# Altium footprint library Metric_Thru_Hole.PcbLib: 91 footprints (part 6 of 6)
Each footprint in its own frame and in the unit in brackets; x right, y up, seen from the top. Pads: shape width x height; smd on the part's side, far side on the other; paste and mask are expansions set on the pad; w line width, h text height; cw(c..) or ccw(c..) is an arc to the next point about the centre after c.
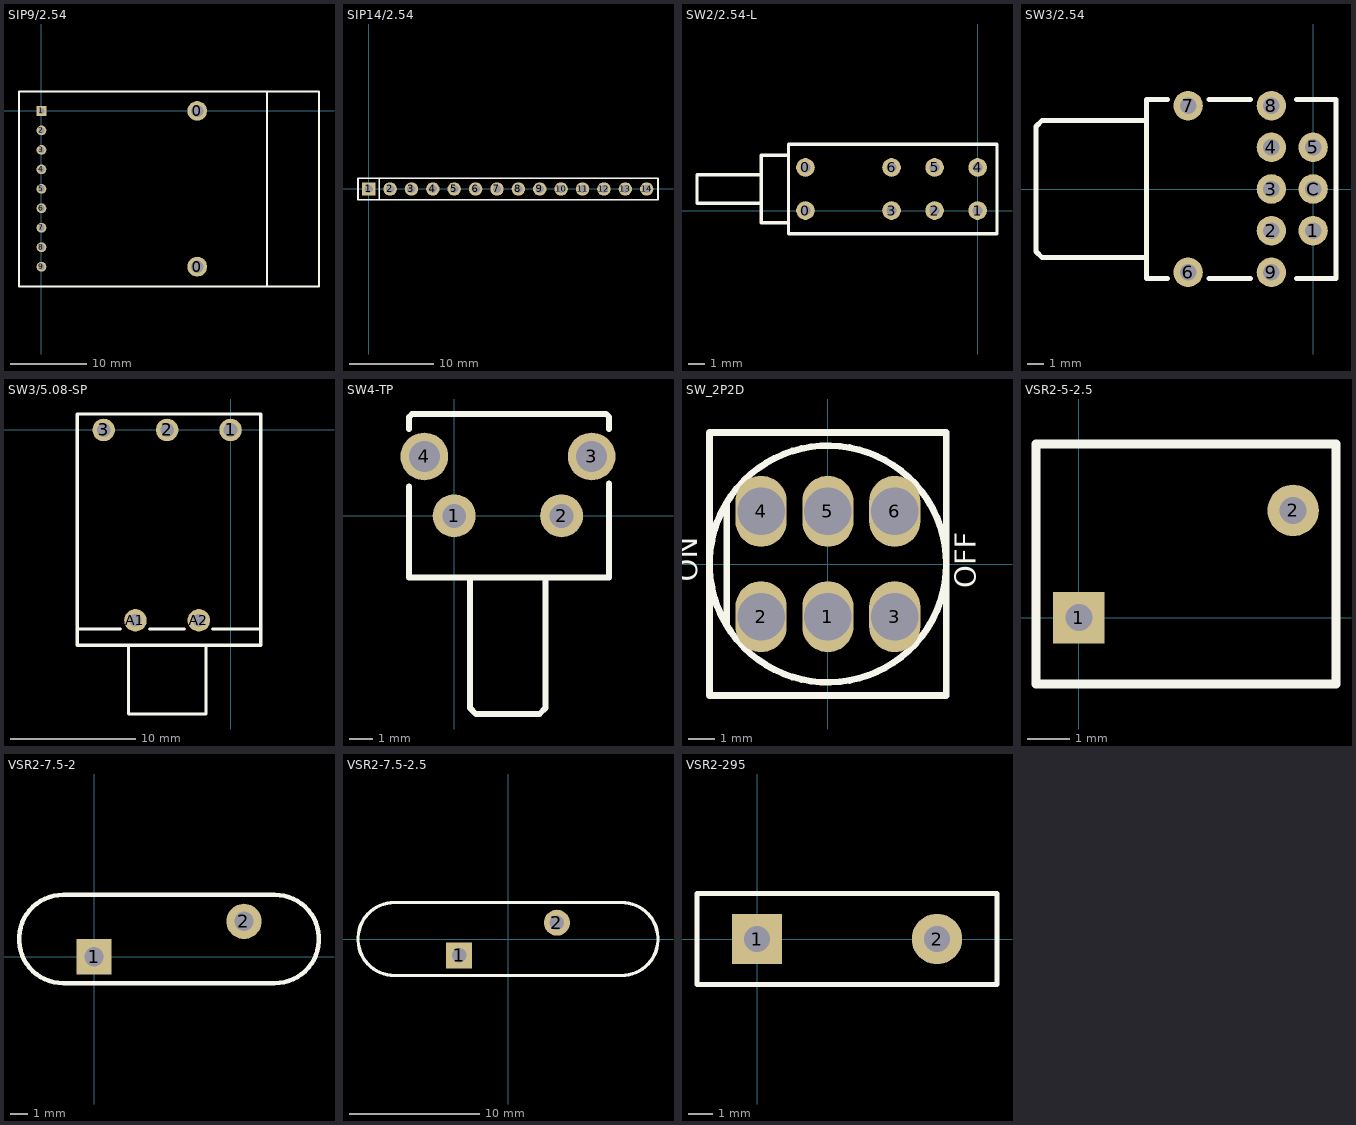
[diagram p5: the footprints below, top view; thin cyan lines are the x and y axes]

## SIP9/2.54 [mm] "9 Leads,Pitch=2.54mm,焊盘: 外径1.28mm,孔径0.8mm"
height 11.18
pads (11):
  round 2.56 hole 1.6: 0(20.32,-20.32) 0(20.32,0)
  rect 1.28x1.28 hole 0.8: 1(0,0)
  round 1.28 hole 0.8: 2(0,-2.54) 3(0,-5.08) 4(0,-7.62) 5(0,-10.16) 6(0,-12.7) 7(0,-15.24) 8(0,-17.78) 9(0,-20.32)
Top Overlay:
  lines w0.254: 29.398,-22.885 29.398,2.515 ; -2.922,-22.885 36.198,-22.885 36.198,2.515 -2.922,2.515 -2.922,-22.885

## SIP14/2.54 [mm] "14 Leads,Pitch=2.54mm,焊盘: 外径1.6mm,孔径1mm"
pads (14):
  rect 1.6x1.6 hole 1: 1(0,0)
  round 1.6 hole 1: 2(2.54,0) 3(5.08,0) 4(7.62,0) 5(10.16,0) 6(12.7,0) 7(15.24,0) 8(17.78,0) 9(20.32,0) 10(22.86,0) 11(25.4,0) 12(27.94,0) 13(30.48,0) 14(33.02,0)
Top Overlay:
  lines w0.203: 1.27,-1.27 1.27,1.27 ; -1.27,-1.27 -1.27,1.27 34.366,1.27 34.366,-1.27 -1.27,-1.27

## SW2/2.54-L [mm] "Toggle Switch with bicolor LED"
pads (8):
  round 1.1 hole 0.6: 0(-10.16,0) 0(-10.16,2.54) 1(0,0) 2(-2.54,0) 3(-5.08,0) 4(0,2.54) 5(-2.54,2.54) 6(-5.08,2.54)
Top Overlay:
  lines w0.2: -12.836,0.42 -16.56,0.42 -16.56,2.12 -12.76,2.12 ; -12.76,-0.73 -12.76,3.251 ; -12.76,3.27 -11.16,3.27 ; -12.725,-0.73 -11.236,-0.73 ; -11.16,-1.38 -11.16,3.92 1.143,3.92 1.143,-1.38 -11.16,-1.38
3D body "19881.stp": height 8.5, standoff -3.1, extent -22.8,-1.536 0.194,4.064

## SW3/2.54 [mm] "NKK SK-Series Keylock PCB Mount 3-Position with Right Angle"
height 12
pads (10):
  round 1.8 hole 1: 1(0,-2.54) 2(-2.54,-2.54) 3(-2.54,0) 4(-2.54,2.54) 5(0,2.54) 6(-7.62,-5.08) 7(-7.62,5.08) 8(-2.54,5.08) 9(-2.54,-5.08) C(0,0)
Top Overlay:
  lines w0.305: -10.16,-4.191 -16.51,-4.191 -16.891,-3.81 -16.891,3.81 -16.51,4.191 -10.16,4.191 ; -8.89,-5.461 -10.16,-5.461 -10.16,5.461 -8.89,5.461 ; -6.35,-5.461 -3.81,-5.461 ; -6.35,5.461 -3.81,5.461 ; -1.016,-5.461 1.397,-5.461 1.397,5.461 -1.016,5.461
3D body "SK13AEG30_2_03.stp": height 12.01, standoff -3.96, extent -35.154,-5.54 1.27,5.54

## SW3/5.08-SP [mm]
height 13.5
pads (5):
  round 1.8 hole 1.1: 1(0,0) 2(-5.08,0) 3(-10.16,0)
  round 1.8 hole 1: A1(-7.62,-15.24) A2(-2.54,-15.24)
Top Overlay:
  lines w0.254: -12.28,-15.94 -8.839,-15.94 ; -8.18,-17.279 -8.18,-22.74 -1.98,-22.74 -1.98,-17.279 ; -6.48,-15.94 -3.68,-15.94 ; -1.422,-15.94 2.42,-15.94 ; -12.28,-17.24 2.42,-17.24 2.42,1.28 -12.28,1.28 -12.28,-17.24

## SW4-TP [mm] "Tactile Pushbutton Switch, Single Pole , Single Throw Configuration,Contact Rating = 50mA, Operating Function = Off [On]"
height 7.01
pads (4):
  round 1.8 hole 1: 1(0,0) 2(4.5,0)
  round 2 hole 1.3: 3(5.76,2.49) 4(-1.25,2.49)
Top Overlay:
  lines w0.254: -1.885,1.22 -1.885,-2.59 6.497,-2.59 6.497,1.347 ; -1.885,3.633 -1.885,4.141 -1.758,4.268 6.37,4.268 6.497,4.141 6.497,3.633 ; 0.655,-2.59 0.655,-8.051 0.909,-8.305 3.576,-8.305 3.83,-8.051 3.83,-2.59
3D body "c-1-1825027-1-g1-3d.stp": height 7.03, standoff -3.49, extent -1.91,-8.388 6.497,3.97

## SW_2P2D [mm] "立式双刀双开关"
height 23
pads (6):
  oval 1.95x2.7 hole 1.8: 1(0,-2) 2(-2.54,-2) 3(2.54,-2) 4(-2.54,2) 5(0,2) 6(2.54,2)
Top Overlay:
  circle w0.254: c0,0 r4.5
  lines w0.254: -3.85,-2.3 -3.85,2.25 ; -4.5,-5 4.5,-5 4.5,5 -4.5,5 -4.5,-5
  text "ON" at -4.975,-0.675 h0.8
  text "OFF" at 5.625,-0.925 h0.8

## VSR2-5-2.5 [mm] "片式器件，直径7mm,高10mm,厚5.6mm"
height 10
pads (2):
  rect 1.2x1.2 hole 0.635: 1(0,0)
  round 1.2 hole 0.635: 2(5,2.5)
Top Overlay:
  lines w0.203: -1,-1.55 6,-1.55 6,4.05 -1,4.05 -1,-1.55

## VSR2-7.5-2 [mm] "17*5mm"
height 20
pads (2):
  rect 2x2 hole 1.1: 1(0,0)
  round 2 hole 1.1: 2(8.5,2)
Top Overlay:
  lines w0.254: -1.75,-1.5 cw(c-1.75,1) -1.75,3.5 10.25,3.5 cw(c10.25,1) 10.25,-1.5 -1.75,-1.5
3D body "SW3dPS-Panasonic ECK-A3D102KBP.STEP": height 9.03, standoff -4.16, extent 0.233,-0.254 8.234,2.139

## VSR2-7.5-2.5 [mm] "23*5.6mm"
height 26.5
pads (2):
  rect 2x2 hole 1.1: 1(-3.75,-1.25)
  round 2 hole 1.1: 2(3.75,1.25)
Top Overlay:
  lines w0.254: -8.7,-2.8 cw(c-8.7,0) -8.7,2.8 8.7,2.8 cw(c8.7,0) 8.7,-2.8 -8.7,-2.8
3D body "SW3dPS-Panasonic ECK-A3D102KBP.STEP": height 9.03, standoff -4.16, extent -4.017,-1.254 3.984,1.139

## VSR2-295 [mm] "片式器件，直径12.5mm,高15.5mm"
height 15.5
pads (2):
  rect 2.1x2.1 hole 1.1: 1(0,0)
  round 2.1 hole 1.1: 2(7.5,0)
Top Overlay:
  lines w0.203: -2.5,-1.9 10,-1.9 10,1.9 -2.5,1.9 -2.5,-1.9
3D body "SW3dPS-Panasonic ECK-A3D102KBP.STEP": height 12.03, standoff -1.16, extent -0.314,-1.377 7.687,1.016